# Altium footprint library IC.PCBLIB: 359 footprints (part 8 of 23)
Each footprint in its own frame and in the unit in brackets; x right, y up, seen from the top. Pads: shape width x height; smd on the part's side, far side on the other; paste and mask are expansions set on the pad; w line width, h text height; cw(c..) or ccw(c..) is an arc to the next point about the centre after c.
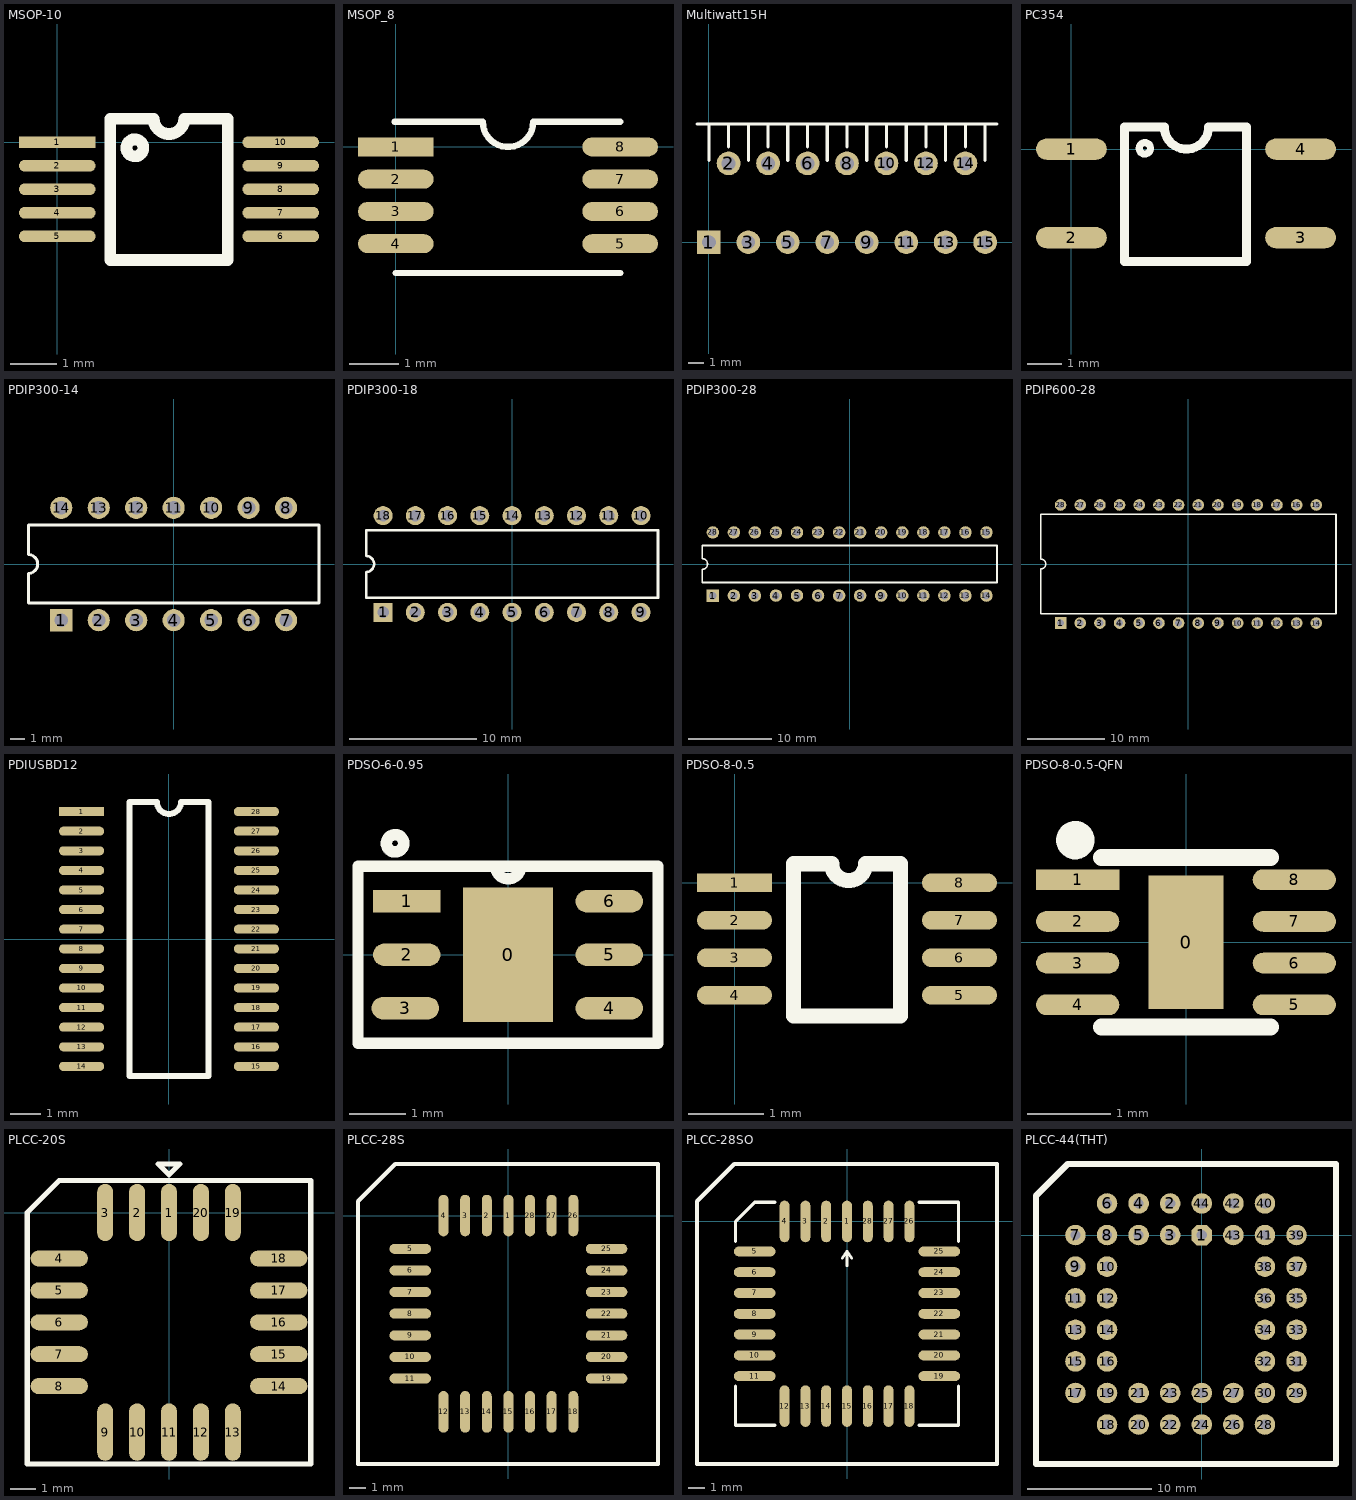
[diagram p7: the footprints below, top view; thin cyan lines are the x and y axes]

## MSOP-10 [mil]
pads (10):
  rect 65x10 smd: 1(0,0)
  oval 65x10 smd: 2(0,-20) 3(0,-40) 4(0,-60) 5(0,-80) 6(190,-80) 7(190,-60) 8(190,-40) 9(190,-20) 10(190,0)
TopOverlay:
  lines w10: 66,-12 cw(c66,-4.79) 67.02,-11.93 ; 45,-100 145,-100 145,20 108,20 cw(c95,20) 82,20 45,20 45,-100

## MSOP_8 [mil]
pads (8):
  rect 60x15 smd: 1(0,0)
  oval 60x15 smd: 2(0,-25.59) 3(0,-51.18) 4(0,-76.77) 5(178,-76.77) 6(178,-51.18) 7(178,-25.59) 8(178,0)
TopOverlay:
  lines w5: -1,20 69,20 ccw(c89,20) 109,20 ; 0,-100 178,-100 ; 110,20 178,20

## Multiwatt15H [mil] "L298"
pads (15):
  rect 60x60 hole 35: 1(0,0)
  round 60 hole 35: 2(50,200) 3(100,0) 4(150,200) 5(200,0) 6(250,200) 7(300,0) 8(350,200) 9(400,0) 10(450,200) 11(500,0) 12(550,200) 13(600,0) 14(650,200) 15(700,0)
TopOverlay:
  lines w7.87: -30,300 730,300 ; 0,207.48 0,300 ; 50,241.67 50,300 ; 100,207.48 100,300 ; 150,241.67 150,300 ; 200,207.48 200,300 ; 250,241.67 250,300 ; 300,207.48 300,300 ; 350,241.67 350,300 ; 400,207.48 400,300 ; 450,241.67 450,300 ; 500,207.48 500,300 ; 550,241.67 550,300 ; 600,207.48 600,300 ; 650,241.67 650,300 ; 700,207.48 700,300

## PC354 [mil]
pads (4):
  oval 80x24.02 smd: 1(0,0) 2(0,-100)
  oval 80x24 smd: 3(259.02,-100) 4(259.02,0)
TopOverlay:
  circle w8: c83.02,1 r6.4
  lines w10: 60.02,-127 60.02,25 105.02,25 ccw(c130.02,25) 155.02,25 198.02,25 198.02,-127 60.02,-127

## PDIP300-14 [mm] "DIP, Plastic; 14 Leads; Row Spacing 7.62 mm; Pitch 2.54 mm"
height 4.32
pads (14):
  rect 1.5x1.5 hole 0.9: 1(-7.62,-3.81)
  round 1.5 hole 0.9: 2(-5.08,-3.81) 3(-2.54,-3.81) 4(0,-3.81) 5(2.54,-3.81) 6(5.08,-3.81) 7(7.62,-3.81) 8(7.62,3.81) 9(5.08,3.81) 10(2.54,3.81) 11(0,3.81) 12(-2.54,3.81) 13(-5.08,3.81) 14(-7.62,3.81)
TopOverlay:
  lines w0.2: -9.85,-2.65 -9.85,-0.635 ccw(c-9.85,0) -9.85,0.635 -9.85,2.65 9.85,2.65 9.85,-2.65 -9.85,-2.65

## PDIP300-18 [mm] "DIP, Plastic; 18 Leads; Row Spacing 7.62 mm; Pitch 2.54 mm"
height 4.32
pads (18):
  rect 1.5x1.5 hole 0.9: 1(-10.16,-3.81)
  round 1.5 hole 0.9: 2(-7.62,-3.81) 3(-5.08,-3.81) 4(-2.54,-3.81) 5(0,-3.81) 6(2.54,-3.81) 7(5.08,-3.81) 8(7.62,-3.81) 9(10.16,-3.81) 10(10.16,3.81) 11(7.62,3.81) 12(5.08,3.81) 13(2.54,3.81) 14(0,3.81) 15(-2.54,3.81) 16(-5.08,3.81) 17(-7.62,3.81) 18(-10.16,3.81)
TopOverlay:
  lines w0.2: -11.5,-2.65 -11.5,-0.635 ccw(c-11.5,0) -11.5,0.635 -11.5,2.65 11.5,2.65 11.5,-2.65 -11.5,-2.65

## PDIP300-28 [mm] "DIP, Plastic, Skinny; 28 Leads; Row Spacing 7.62 mm; Pitch 2.54 mm"
height 4.07
pads (28):
  rect 1.5x1.5 hole 0.9: 1(-16.51,-3.81)
  round 1.5 hole 0.9: 2(-13.97,-3.81) 3(-11.43,-3.81) 4(-8.89,-3.81) 5(-6.35,-3.81) 6(-3.81,-3.81) 7(-1.27,-3.81) 8(1.27,-3.81) 9(3.81,-3.81) 10(6.35,-3.81) 11(8.89,-3.81) 12(11.43,-3.81) 13(13.97,-3.81) 14(16.51,-3.81) 15(16.51,3.81) 16(13.97,3.81) 17(11.43,3.81) 18(8.89,3.81) 19(6.35,3.81) 20(3.81,3.81) 21(1.27,3.81) 22(-1.27,3.81) 23(-3.81,3.81) 24(-6.35,3.81) 25(-8.89,3.81) 26(-11.43,3.81) 27(-13.97,3.81) 28(-16.51,3.81)
TopOverlay:
  lines w0.2: -17.78,-2.225 17.78,-2.225 17.78,2.225 -17.78,2.225 -17.78,0.635 cw(c-17.78,0) -17.78,-0.635 -17.78,-2.225

## PDIP600-28 [mm] "DIP, Plastic; 28 Leads; Row Spacing 15.24 mm; Pitch 2.54 mm"
height 4.83
pads (28):
  rect 1.5x1.5 hole 0.9: 1(-16.51,-7.62)
  round 1.5 hole 0.9: 2(-13.97,-7.62) 3(-11.43,-7.62) 4(-8.89,-7.62) 5(-6.35,-7.62) 6(-3.81,-7.62) 7(-1.27,-7.62) 8(1.27,-7.62) 9(3.81,-7.62) 10(6.35,-7.62) 11(8.89,-7.62) 12(11.43,-7.62) 13(13.97,-7.62) 14(16.51,-7.62) 15(16.51,7.62) 16(13.97,7.62) 17(11.43,7.62) 18(8.89,7.62) 19(6.35,7.62) 20(3.81,7.62) 21(1.27,7.62) 22(-1.27,7.62) 23(-3.81,7.62) 24(-6.35,7.62) 25(-8.89,7.62) 26(-11.43,7.62) 27(-13.97,7.62) 28(-16.51,7.62)
TopOverlay:
  lines w0.2: -19.05,-6.45 -19.05,-0.635 ccw(c-19.05,0) -19.05,0.635 -19.05,6.45 19.05,6.45 19.05,-6.45 -19.05,-6.45

## PDIUSBD12 [mm]
pads (28):
  rect 1.5x0.3 smd: 1(-2.9,4.225)
  oval 1.5x0.3 smd: 2(-2.9,3.575) 3(-2.9,2.925) 4(-2.9,2.275) 5(-2.9,1.625) 6(-2.9,0.975) 7(-2.9,0.325) 8(-2.9,-0.325) 9(-2.9,-0.975) 10(-2.9,-1.625) 11(-2.9,-2.275) 12(-2.9,-2.925) 13(-2.9,-3.575) 14(-2.9,-4.225) 15(2.9,-4.225) 16(2.9,-3.575) 17(2.9,-2.925) 18(2.9,-2.275) 19(2.9,-1.625) 20(2.9,-0.975) 21(2.9,-0.325) 22(2.9,0.325) 23(2.9,0.975) 24(2.9,1.625) 25(2.9,2.275) 26(2.9,2.925) 27(2.9,3.575) 28(2.9,4.225)
TopOverlay:
  lines w0.198: -0.403,4.55 ccw(c0,4.55) 0.403,4.55
  lines w0.2: -0.403,4.55 -1.315,4.55 -1.315,-4.55 1.315,-4.55 1.315,4.55 0.402,4.55

## PDSO-6-0.95 [mm]
pads (7):
  rect 1.6x2.4 smd: 0(0,0)
  rect 1.2x0.4 smd: 1(-1.8,0.95)
  oval 1.2x0.4 smd: 2(-1.8,0) 3(-1.825,-0.95) 4(1.8,-0.95) 5(1.8,0) 6(1.8,0.95)
TopOverlay:
  circle w0.203: c-2.008,1.981 r0.154
  lines w0.2: -0.222,1.575 ccw(c0.003,1.575) 0.228,1.575
  lines w0.203: -2.667,-1.575 -2.667,1.575 2.667,1.575 2.667,-1.575 -2.667,-1.575

## PDSO-8-0.5 [mm]
pads (8):
  rect 1x0.25 smd: 1(0,0)
  oval 1x0.25 smd: 2(0,-0.5) 3(0,-1) 4(0,-1.5) 5(3,-1.5) 6(3,-1) 7(3,-0.5) 8(3,0)
TopOverlay:
  lines w0.2: 0.787,0.254 0.787,-1.778 2.213,-1.778 2.213,0.254 ; 1.295,0.254 ccw(c1.521,0.254) 1.747,0.254
  lines w0.203: 0.787,0.254 1.295,0.254 ; 1.747,0.254 2.213,0.254

## PDSO-8-0.5-QFN [mm]
pads (9):
  rect 0.9x1.6 smd: 0(0,0)
  rect 1x0.25 smd: 1(-1.3,0.75)
  oval 1x0.25 smd: 2(-1.3,0.25) 3(-1.3,-0.25) 4(-1.3,-0.75) 5(1.3,-0.75) 6(1.3,-0.25) 7(1.3,0.25) 8(1.3,0.75)
TopOverlay:
  circle w0.254: c-1.328,1.225 r0.103
  lines w0.2: -1.016,-1.016 1.016,-1.016
  lines w0.203: -1.016,1.016 1.016,1.016

## PLCC-20S [mil]
pads (20):
  oval 25x90 smd: 1(0,0) 2(-50,0) 3(-100,0) 9(-100,-344) 10(-50,-344) 11(0,-344) 12(50,-344) 13(100,-344) 19(100,0) 20(50,0)
  oval 90x25 smd: 4(-172,-72) 5(-172,-122) 6(-172,-172) 7(-172,-222) 8(-172,-272) 14(172,-272) 15(172,-222) 16(172,-172) 17(172,-122) 18(172,-72)
TopOverlay:
  lines w8: -222,-394 222,-394 222,50 -172,50 -222,0 -222,-394 ; -17,76 0,59 17,76 -17,76

## PLCC-28S [mm]
pads (28):
  oval 0.6x2.5 smd: 1(0,0) 2(-1.3,0) 3(-2.6,0) 4(-3.9,0) 12(-3.9,-11.8) 13(-2.6,-11.8) 14(-1.3,-11.8) 15(0,-11.8) 16(1.3,-11.8) 17(2.6,-11.8) 18(3.9,-11.8) 26(3.9,0) 27(2.6,0) 28(1.3,0)
  oval 2.5x0.6 smd: 5(-5.9,-2) 6(-5.9,-3.3) 7(-5.9,-4.6) 8(-5.9,-5.9) 9(-5.9,-7.2) 10(-5.9,-8.5) 11(-5.9,-9.8) 19(5.9,-9.8) 20(5.9,-8.5) 21(5.9,-7.2) 22(5.9,-5.9) 23(5.9,-4.6) 24(5.9,-3.3) 25(5.9,-2)
TopOverlay:
  lines w0.254: -9.042,-14.935 8.992,-14.935 8.992,3.099 -6.807,3.099 -9.042,0.864 -9.042,-14.935

## PLCC-28SO [mm]
pads (28):
  oval 0.6x2.5 smd: 1(0,0) 2(-1.25,0) 3(-2.5,0) 4(-3.75,0) 12(-3.75,-11.1) 13(-2.5,-11.1) 14(-1.25,-11.1) 15(0,-11.1) 16(1.25,-11.1) 17(2.5,-11.1) 18(3.75,-11.1) 26(3.75,0) 27(2.5,0) 28(1.25,0)
  oval 2.5x0.6 smd: 5(-5.55,-1.8) 6(-5.55,-3.05) 7(-5.55,-4.3) 8(-5.55,-5.55) 9(-5.55,-6.8) 10(-5.55,-8.05) 11(-5.55,-9.3) 19(5.55,-9.3) 20(5.55,-8.05) 21(5.55,-6.8) 22(5.55,-5.55) 23(5.55,-4.3) 24(5.55,-3.05) 25(5.55,-1.8)
TopOverlay:
  lines w0.154: -0.279,-2.21 0,-1.778 ; 0,-2.667 0,-1.778 ; 0.279,-2.21 0,-1.778
  lines w0.2: -6.7,-9.9 -6.7,-12.25 -4.35,-12.25 ; -6.7,-1.2 -6.7,0 -5.55,1.15 -4.35,1.15 ; 4.35,-12.25 6.7,-12.25 6.7,-9.9 ; 4.35,1.15 6.7,1.15 6.7,-1.2
  lines w0.254: -9.017,-14.58 9.017,-14.58 9.017,3.454 -6.782,3.454 -9.017,1.219 -9.017,-14.58

## PLCC-44(THT) [mil]
pads (44):
  oct 65x65 hole 32: 1(0,0)
  round 65 hole 32: 2(-100,100) 3(-100,0) 4(-200,100) 5(-200,0) 6(-300,100) 7(-400,0) 8(-300,0) 9(-400,-100) 10(-300,-100) 11(-400,-200) 12(-300,-200) 13(-400,-300) 14(-300,-300) 15(-400,-400) 16(-300,-400) 17(-400,-500) 18(-300,-600) 19(-300,-500) 20(-200,-600) 21(-200,-500) 22(-100,-600) 23(-100,-500) 24(0,-600) 25(0,-500) 26(100,-600) 27(100,-500) 28(200,-600) 29(300,-500) 30(200,-500) 31(300,-400) 32(200,-400) 33(300,-300) 34(200,-300) 35(300,-200) 36(200,-200) 37(300,-100) 38(200,-100) 39(300,0) 40(200,100) 41(200,0) 42(100,100) 43(100,0) 44(0,100)
TopOverlay:
  lines w20: -25,225 425,225 425,-725 -525,-725 -525,125 -425,225 0,225